# Altium footprint library Library.PcbLib: 292 footprints (part 8 of 20)
Each footprint in its own frame and in the unit in brackets; x right, y up, seen from the top. Pads: shape width x height; smd on the part's side, far side on the other; paste and mask are expansions set on the pad; w line width, h text height; cw(c..) or ccw(c..) is an arc to the next point about the centre after c.
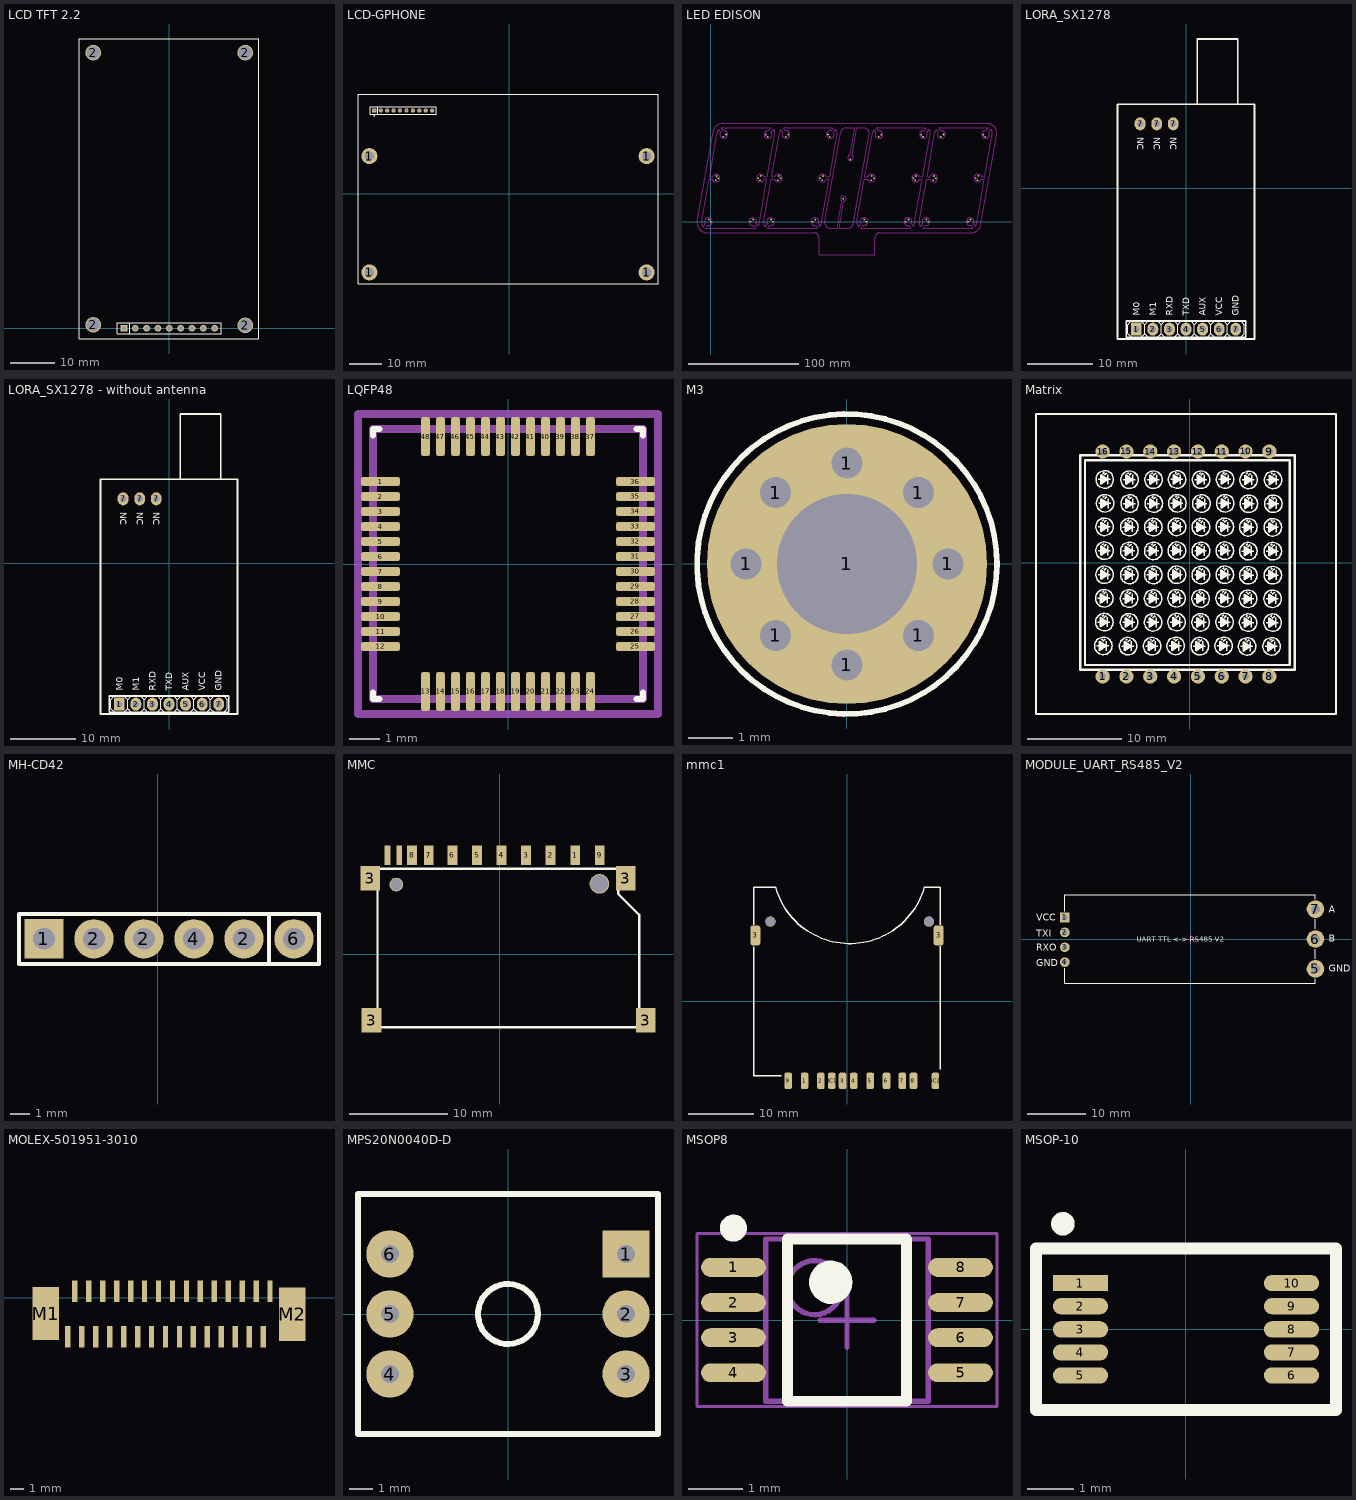
[diagram p7: the footprints below, top view; thin cyan lines are the x and y axes]

## LCD TFT 2.2 [mm]
height 8.5
pads (17):
  rect 1.52x1.52 hole 1.02: 1(-10.16,0)
  round 3.5 hole 3: 2(-17.018,0.762) 2(-17.018,61.722) 2(17.018,0.635) 2(17.018,61.722)
  round 1.52 hole 1.02: 2(-7.62,0) 3(-5.08,0) 4(-2.54,0) 5(0,0) 6(2.54,0) 7(5.08,0) 8(7.62,0) 9(10.16,0)
  round 0 all layers, no hole: ""(-17.018,0.762) ""(-17.018,61.722) ""(17.018,0.635) ""(17.018,61.722)
Top Overlay:
  lines w0.2: -8.89,-1.27 -8.89,1.27 ; -20.193,-2.413 -20.193,64.77 20.066,64.77 20.066,-2.413 -20.193,-2.413 ; -11.68,-1.27 -11.68,1.27 11.68,1.27 11.68,-1.27 -11.68,-1.27
3D body "??????? TFT 2.2'.STEP": height 15.2, standoff 2.5, extent -20,-2.286 20,64.714
3D body "61300911821.stp": height 8.51, standoff -3.09, extent -11.68,-1.25 11.68,1.25

## LCD-GPHONE [mm] "10p, 1 row, straight, gold plating"
height 4.3
pads (19):
  round 5 hole 3: 1(-43.561,-24.511) 1(-43.561,11.684) 1(42.672,-24.511) 1(42.672,11.684)
  rect 1.3x1.3 hole 0.8: 1(-42.037,25.908)
  round 1.3 hole 0.8: 2(-40.037,25.908) 3(-38.037,25.908) 4(-36.037,25.908) 5(-34.037,25.908) 6(-32.037,25.908) 7(-30.037,25.908) 8(-28.037,25.908) 9(-26.037,25.908) 10(-24.037,25.908)
  round 0 all layers, no hole: ""(-43.561,-24.511) ""(-43.561,11.684) ""(42.672,-24.511) ""(42.672,-24.511) ""(42.672,11.684)
Top Overlay:
  circle w0.25: c-42.037,24.326 r0.125
  lines w0.127: -41.037,24.708 -41.037,27.108 ; -43.287,24.708 -22.787,24.708 -22.787,27.108 -43.287,27.108 -43.287,24.708
  lines w0.2: -47.117,-28.067 46.228,-28.067 46.228,30.988 -47.117,30.988 -47.117,-5.588 -47.117,-20.574 -47.117,-28.067
3D body "62001011821.stp": height 4.31, standoff -2.39, extent -43.287,24.708 -22.787,27.108

## LED EDISON [mil]
pads (58):
  round 60 smd: 9(-65.16,77.44) 9(0,0) 9(180.94,1473.23) 9(207.76,1628.43) 9(273.35,1550.79) 9(453.86,3024.21) 9(546.26,3101.1) 9(1417.32,0) 9(1509.61,77.44) 9(1690.67,1550.79) 9(1755.75,1473.23) 9(1782.52,1628.43) 9(1963.58,3101.1) 9(2028.66,3024.21) 9(2147.48,77.44) 9(2212.64,0) 9(2393.58,1473.23) 9(2420.39,1628.43) 9(2485.98,1550.79) 9(2666.5,3024.21) 9(2758.9,3101.1) 9(3629.96,0) 9(3722.24,77.44) 9(3903.31,1550.79) 9(3968.39,1473.23) 9(3995.16,1628.43) 9(4176.22,3101.1) 9(4241.3,3024.21) 9(4721.97,814.61) 9(4968.11,2210.39) 9(5462.52,77.44) 9(5527.68,0) 9(5708.62,1473.23) 9(5735.43,1628.43) 9(5801.02,1550.79) 9(5981.54,3024.21) 9(6073.94,3101.1) 9(6945,0) 9(7037.28,77.44) 9(7218.35,1550.79) 9(7283.43,1473.23) 9(7310.2,1628.43) 9(7491.26,3101.1) 9(7556.34,3024.21) 9(7675.16,77.44) 9(7740.31,0) 9(7921.26,1473.23) 9(7948.07,1628.43) 9(8013.66,1550.79) 9(8194.17,3024.21) 9(8286.57,3101.1) 9(9157.64,0) 9(9249.92,77.44) 9(9430.98,1550.79) 9(9496.06,1473.23) 9(9522.83,1628.43) 9(9703.9,3101.1) 9(9768.98,3024.21)
Keep-Out Layer:
  drawing of 1510 lines, arcs and shapes, not listed

## LORA_SX1278 [mm]
pads (10):
  rect 1.65x2 hole 1: 1(-7.666,-21.599)
  oval 1.65x2 hole 1: 2(-5.126,-21.599) 3(-2.586,-21.599) 4(-0.046,-21.599) 5(2.494,-21.599) 6(5.034,-21.599) 7(-7.087,9.901) 7(-4.547,9.901) 7(-2.007,9.901) 7(7.574,-21.599)
Top Overlay:
  lines w0.1: 6.874,-20.329 6.304,-20.899 ; 6.876,-20.331 8.341,-20.331 8.908,-20.899 ; 8.914,-20.904 8.914,-22.299 8.344,-22.869 6.874,-22.869 6.304,-22.299 ; -6.396,-22.299 -5.826,-22.869 -4.426,-22.869 -3.856,-22.299 ; -6.396,-22.299 -6.966,-22.869 -8.396,-22.869 -8.976,-22.289 -8.976,-20.899 -8.406,-20.329 -6.966,-20.329 -6.396,-20.899 ; -6.396,-22.299 -6.396,-20.899 ; -6.396,-20.899 -5.826,-20.329 -4.426,-20.329 -3.856,-20.899 ; -3.856,-22.299 -3.286,-22.869 -1.886,-22.869 -1.316,-22.299 ; -3.856,-22.299 -3.856,-20.899 ; -3.856,-20.899 -3.286,-20.329 -1.886,-20.329 -1.316,-20.899 ; -1.316,-22.299 -0.746,-22.869 0.654,-22.869 1.224,-22.299 ; -1.316,-22.299 -1.316,-20.899 ; -1.316,-20.899 -0.746,-20.329 0.654,-20.329 1.224,-20.899 ; 1.224,-22.299 1.794,-22.869 3.194,-22.869 3.764,-22.299 ; 1.224,-22.299 1.224,-20.899 ; 1.224,-20.899 1.794,-20.329 3.194,-20.329 3.764,-20.899 ; 3.764,-22.299 4.334,-22.869 5.734,-22.869 6.304,-22.299 ; 3.764,-22.299 3.764,-20.899 ; 3.764,-20.899 4.334,-20.329 5.734,-20.329 6.304,-20.899 ; 6.304,-22.299 6.304,-20.899
  lines w0.254: -9.194,-22.818 9.094,-22.818 9.094,-20.379 ; -9.191,-22.799 -9.19,-20.329 9.098,-20.329 ; -10.547,-23.099 -10.547,12.901 10.453,12.901 10.453,-23.099 -10.547,-23.099 ; 1.703,12.901 7.903,12.901 7.903,22.901 1.703,22.901 1.703,12.901
  text "NC" at -7.549,7.853 h1
  text "NC" at -5.009,7.853 h1
  text "NC" at -2.469,7.853 h1
  text "GND" at 8.066,-19.551 h1
  text "VCC" at 5.526,-19.551 h1
  text "AUX" at 2.986,-19.551 h1
  text "TXD" at 0.446,-19.551 h1
  text "RXD" at -2.094,-19.551 h1
  text "M1" at -4.634,-19.551 h1
  text "M0" at -7.174,-19.551 h1
Mechanical 15:
  lines w0.003: -0.872,2.444 -0.872,2.445
  lines w0.2: -0.796,-21.599 0.704,-21.599 ; -0.046,-22.349 -0.046,-20.849
3D body "E32-TTL-100 module.STEP": height 69.75, standoff -4.53, extent -128.546,-23.064 11.414,53.958

## LORA_SX1278 - without antenna [mm]
pads (10):
  rect 1.65x2 hole 1: 1(-7.666,-21.599)
  oval 1.65x2 hole 1: 2(-5.126,-21.599) 3(-2.586,-21.599) 4(-0.046,-21.599) 5(2.494,-21.599) 6(5.034,-21.599) 7(-7.087,9.901) 7(-4.547,9.901) 7(-2.007,9.901) 7(7.574,-21.599)
Top Overlay:
  lines w0.1: 6.874,-20.329 6.304,-20.899 ; 6.876,-20.331 8.341,-20.331 8.908,-20.899 ; 8.914,-20.904 8.914,-22.299 8.344,-22.869 6.874,-22.869 6.304,-22.299 ; -6.396,-22.299 -6.396,-20.899 ; -6.396,-22.299 -6.966,-22.869 -8.396,-22.869 -8.976,-22.289 -8.976,-20.899 -8.406,-20.329 -6.966,-20.329 -6.396,-20.899 ; -6.396,-22.299 -5.826,-22.869 -4.426,-22.869 -3.856,-22.299 ; -6.396,-20.899 -5.826,-20.329 -4.426,-20.329 -3.856,-20.899 ; -3.856,-22.299 -3.856,-20.899 ; -3.856,-22.299 -3.286,-22.869 -1.886,-22.869 -1.316,-22.299 ; -3.856,-20.899 -3.286,-20.329 -1.886,-20.329 -1.316,-20.899 ; -1.316,-22.299 -1.316,-20.899 ; -1.316,-22.299 -0.746,-22.869 0.654,-22.869 1.224,-22.299 ; -1.316,-20.899 -0.746,-20.329 0.654,-20.329 1.224,-20.899 ; 1.224,-22.299 1.224,-20.899 ; 1.224,-22.299 1.794,-22.869 3.194,-22.869 3.764,-22.299 ; 1.224,-20.899 1.794,-20.329 3.194,-20.329 3.764,-20.899 ; 3.764,-22.299 3.764,-20.899 ; 3.764,-22.299 4.334,-22.869 5.734,-22.869 6.304,-22.299 ; 3.764,-20.899 4.334,-20.329 5.734,-20.329 6.304,-20.899 ; 6.304,-22.299 6.304,-20.899
  lines w0.254: -9.194,-22.818 9.094,-22.818 9.094,-20.379 ; -9.191,-22.799 -9.19,-20.329 9.098,-20.329 ; -10.547,-23.099 10.453,-23.099 10.453,12.901 -10.547,12.901 -10.547,-23.099 ; 1.703,12.901 1.703,22.901 7.903,22.901 7.903,12.901 1.703,12.901
  text "M0" at -7.174,-19.551 h1
  text "M1" at -4.634,-19.551 h1
  text "RXD" at -2.094,-19.551 h1
  text "TXD" at 0.446,-19.551 h1
  text "AUX" at 2.986,-19.551 h1
  text "VCC" at 5.526,-19.551 h1
  text "GND" at 8.066,-19.551 h1
  text "NC" at -2.469,7.853 h1
  text "NC" at -5.009,7.853 h1
  text "NC" at -7.549,7.853 h1
Mechanical 15:
  lines w0.003: -0.872,2.444 -0.872,2.445
  lines w0.2: -0.796,-21.599 0.704,-21.599 ; -0.046,-22.349 -0.046,-20.849
3D body "E32-TTL-100 module without ant.STEP": height 13.01, standoff -1.53, extent -10.547,-23.099 10.453,25.681

## LQFP48 [mm] "7x7mm, Pitch 0.5mm"
pads (48):
  rrect50% 1.3x0.3 smd: 1(-4.25,2.75) 2(-4.25,2.25) 3(-4.25,1.75) 4(-4.25,1.25) 5(-4.25,0.75) 6(-4.25,0.25) 7(-4.25,-0.25) 8(-4.25,-0.75) 9(-4.25,-1.25) 10(-4.25,-1.75) 11(-4.25,-2.25) 12(-4.25,-2.75) 25(4.25,-2.75) 26(4.25,-2.25) 27(4.25,-1.75) 28(4.25,-1.25) 29(4.25,-0.75) 30(4.25,-0.25) 31(4.25,0.25) 32(4.25,0.75) 33(4.25,1.25) 34(4.25,1.75) 35(4.25,2.25) 36(4.25,2.75)
  rrect50% 0.3x1.3 smd: 13(-2.75,-4.25) 14(-2.25,-4.25) 15(-1.75,-4.25) 16(-1.25,-4.25) 17(-0.75,-4.25) 18(-0.25,-4.25) 19(0.25,-4.25) 20(0.75,-4.25) 21(1.25,-4.25) 22(1.75,-4.25) 23(2.25,-4.25) 24(2.75,-4.25) 37(2.75,4.25) 38(2.25,4.25) 39(1.75,4.25) 40(1.25,4.25) 41(0.75,4.25) 42(0.25,4.25) 43(-0.25,4.25) 44(-0.75,4.25) 45(-1.25,4.25) 46(-1.75,4.25) 47(-2.25,4.25) 48(-2.75,4.25)
Top Overlay:
  lines w0.2: -4.5,-4.29 -4.5,-4.5 -4.29,-4.5 ; -4.5,4.29 -4.5,4.5 -4.29,4.5 ; 4.29,-4.5 4.5,-4.5 4.5,-4.29 ; 4.29,4.5 4.5,4.5 4.5,4.29
Mechanical 1:
  lines w0.254: -4.5,-4.5 4.5,-4.5 4.5,4.5 -4.5,4.5 -4.5,-4.5
Mechanical 3:
  lines w0.254: -5,-5 5,-5 5,5 -5,5 -5,-5
3D body "User Library-LQFP48_Grid_0_5.STEP": height 1.6, standoff 0, extent -4.5,-4.5 4.5,4.5

## M3 [mm]
pads (9):
  round 1 hole 0.7: 1(-2.286,0) 1(-1.616,-1.616) 1(-1.616,1.616) 1(0,-2.286) 1(0,2.286) 1(1.616,-1.616) 1(1.616,1.616) 1(2.286,0)
  round 6.35 hole 3.18: 1(0,0)
Top Overlay:
  circle w0.127: c0,0 r3.4
Bottom Overlay:
  circle w0.127: c0,0 r3.4

## Matrix [mil]
pads (16):
  round 60 hole 30: 1(-366,-478.44) 2(-266,-478.44) 3(-166,-478.44) 4(-66,-478.44) 5(34,-478.44) 6(134,-478.44) 7(234,-478.44) 8(334,-478.44) 9(334,466.44) 10(234,466.44) 11(134,466.44) 12(34,466.44) 13(-66,466.44) 14(-166,466.44) 15(-266,466.44) 16(-366,466.44)
Top Overlay:
  drawing of 588 lines, arcs and shapes, not listed
3D body "User Library-Bicolor-LED-Matrix.step": height 236.82, standoff -314.4, extent -644.92,-634.84 614.92,625

## MH-CD42 [mm]
pads (6):
  rect 2x2 hole 1.1: 1(-5.791,-10.857)
  round 2 hole 1.1: 2(-3.251,-10.857) 2(-0.711,-10.857) 2(4.369,-10.857) 4(1.829,-10.857) 6(6.909,-10.857)
Top Overlay:
  lines w0.2: 5.642,-12.136 5.642,-9.596 ; -7.058,-12.136 8.182,-12.136 8.182,-9.596 -7.058,-9.596 -7.058,-12.136
3D body "61300611121.stp": height 8.54, standoff -3, extent -7.058,-12.136 8.182,-9.596
3D body "MH-CD42.step": height 6.92, standoff 2.45, extent -8.55,-12.5 8.55,12.5

## MMC [mm]
pads (17):
  rect 1x2 smd: 1(7.67,10.109) 2(5.17,10.109) 3(2.67,10.109) 4(0.17,10.109) 5(-2.33,10.109) 6(-4.83,10.109) 7(-7.255,10.109) 8(-8.955,10.109) 9(10.17,10.109)
  rect 2x2.5 smd: 3(-13.208,7.747) 3(-13.081,-6.731) 3(12.827,7.747) 3(14.859,-6.731)
  rect 0.6x2 smd: NC1(-11.455,10.109) NC2(-10.255,10.109)
  round 1.4 hole 1.2: ""(-10.555,7.109)
  round 2 hole 1.8: ""(10.135,7.188)
Top Overlay:
  lines w0.254: -12.471,-7.417 14.199,-7.417 14.199,4.013 12.04,6.172 12.04,8.712 -12.471,8.712 -12.471,-7.417
3D body "SD card.stp": height 2.23, standoff 0.13, extent -11.046,-26.668 12.954,5.332
3D body "693063020911.stp": height 2.75, standoff -0.8, extent -13.511,-8.163 15.289,10.287

## mmc1 [mm] "SD Card socket"
height 2.75
pads (15):
  rrect50% 1.16x2.5 smd: 1(-6.48,-12.15) 2(-3.98,-12.15) 4(1.03,-12.15) 5(3.53,-12.15) 7(8.45,-12.15) 8(10.15,-12.15) 9(-8.98,-12.15) NC1(-2.33,-12.15) NC2(13.5,-12.15)
  rrect50% 1.524x3.048 smd mask+0: 3(-14,10.05) 3(14,10.05)
  rrect50% 1.16x2.5 smd mask+0: 3(-0.68,-12.15) 6(6.03,-12.15)
  round 1.55 hole 1.55 unplated: ""(-11.7,12.15) ""(12.5,12.15)
Top Overlay:
  lines w0.2: -14.22,8.3 -14.22,-11.4 -10,-11.4 ; -14.22,11.7 -14.22,17.391 -14.216,17.396 -10.915,17.396 ccw(c0.441,20.6) 11.799,17.4 14.22,17.4 14.22,11.7 ; 14.22,-10.4 14.22,8.4
3D body "SD card.stp": height 2.79, standoff 0.69, extent -11.365,-9.775 12.635,22.225
3D body "693061010911.stp": height 3.25, standoff -0.15, extent -14.527,-13.11 14.273,16.79

## MODULE_UART_RS485_V2 [mm]
pads (7):
  rect 1.65x1.65 hole 1: 1(-21.5,3.675)
  round 1.65 hole 1: 2(-21.5,1.135) 3(-21.5,-1.405) 4(-21.5,-3.945)
  round 3 hole 1.5: 5(21.2,-5.08) 6(21.2,0) 7(21.2,5.08)
Top Overlay:
  lines w0.2: -21.5,-5 -21.5,-7.5 21.2,-7.5 21.2,-6.8 ; -21.5,4.75 -21.5,7.5 21.2,7.5 21.2,6.8 ; 21.2,-3.33 21.2,-1.73 ; 21.2,1.75 21.2,3.35
  text "TXI" at -26.35,0.4 h1.2
  text "VCC" at -26.4,3.1 h1.2
  text "A" at 23.5,4.5 h1.2
  text "B" at 23.5,-0.5 h1.2
  text "GND" at 23.5,-5.58 h1.2
  text "RXO" at -26.4,-1.98 h1.2
  text "GND" at -26.35,-4.68 h1.2
  text "UART TTL <-> RS485 V2" at -9.25,-0.5 h0.9
Mechanical 15:
  lines w0.2: -1,0 1,0 ; 0,-1 0,1

## MOLEX-501951-3010 [mil] "MOLEX FPC CONNECTOR 30 POSITIONS"
pads (32):
  rect 15x60 smd: 1(374.02,-109.8) 2(393.7,19.37) 3(413.39,-109.8) 4(433.07,19.37) 5(452.76,-109.8) 6(472.44,19.37) 7(492.13,-109.8) 8(511.81,19.37) 9(531.5,-109.8) 10(551.18,19.37) 11(570.87,-109.8) 12(590.55,19.37) 13(610.24,-109.8) 14(629.92,19.37) 15(649.61,-109.8) 16(669.29,19.37) 17(688.98,-109.8) 18(708.66,19.37) 19(728.35,-109.8) 20(748.03,19.37) 21(767.72,-109.8) 22(787.4,19.37) 23(807.09,-109.8) 24(826.77,19.37) 25(846.46,-109.8) 26(866.14,19.37) 27(885.83,-109.8) 28(905.51,19.37) 29(925.2,-109.8) 30(944.88,19.37)
  rect 75x150 smd: M1(311,-44) M2(1008,-46)
3D body "5019513010.stp": height 157.4, standoff -2.05, extent 309,-117.58 1009.79,59.58

## MPS20N0040D-D [mm]
pads (6):
  rect 2x2 hole 0.762: 1(5,2.54)
  round 2 hole 0.762: 2(5,0) 3(5,-2.54) 4(-5,-2.54) 5(-5,0) 6(-5,2.54)
Top Overlay:
  circle w0.254: c0,0 r1.27
  lines w0.254: -6.35,-5.08 -6.35,5.08 6.35,5.08 6.35,-5.08 -6.35,-5.08
3D body "MPS20N0040D-D.STEP": height 9.45, standoff -4.18, extent -5.399,-4.15 5.399,4.15

## MSOP8 [mm] "MSOP, 8-Leads, Body 3.00x3.00mm, Pitch 0.65mm, IPC High Density"
height 1
pads (8):
  oval 1.2x0.35 smd: 1(-2.1,0.975) 2(-2.1,0.325) 3(-2.1,-0.325) 4(-2.1,-0.975) 5(2.1,-0.975) 6(2.1,-0.325) 7(2.1,0.325) 8(2.1,0.975)
Top Overlay:
  circle w0.4: c-0.3,0.7 r0.2
  circle w0.25: c-2.1,1.7 r0.125
  lines w0.2: -1.1,-1.5 1.1,-1.5 1.1,1.5 -1.1,1.5 -1.1,-1.5
Mechanical 13:
  circle w0.1: c-0.6,0.6 r0.5
  lines w0.1: -1.5,-1.5 1.5,-1.5 1.5,1.5 -1.5,1.5 -1.5,-1.5
Mechanical 15:
  lines w0.05: -2.775,-1.6 2.775,-1.6 2.775,1.6 -2.775,1.6 -2.775,-1.6
  lines w0.1: -0.5,0 0.5,0 ; 0,-0.5 0,0.5
3D body "29213.stp": height 0.94, standoff -0.04, extent -2,-1.45 2,1.45

## MSOP-10 [mm] "MSOP PACKET pitch 0.5mm, 10 pin"
pads (10):
  rect 1.2x0.35 smd: 1(-2.286,1)
  oval 1.2x0.35 smd: 2(-2.286,0.5) 3(-2.286,0) 4(-2.286,-0.5) 5(-2.286,-1) 6(2.286,-1) 7(2.286,-0.5) 8(2.286,0) 9(2.286,0.5) 10(2.286,1)
Top Overlay:
  circle w0.254: c-2.667,2.286 r0.127
  lines w0.254: -3.25,-1.75 3.25,-1.75 3.25,1.75 -3.25,1.75 -3.25,-1.75
3D body "MSOP-10 0.50p 3mm.step": height 1, standoff 0, extent -2.45,-1.5 2.45,1.5